# Altium footprint library Atlan.PcbLib: 283 footprints (part 17 of 18)
Each footprint in its own frame and in the unit in brackets; x right, y up, seen from the top. Pads: shape width x height; smd on the part's side, far side on the other; paste and mask are expansions set on the pad; w line width, h text height; cw(c..) or ccw(c..) is an arc to the next point about the centre after c.
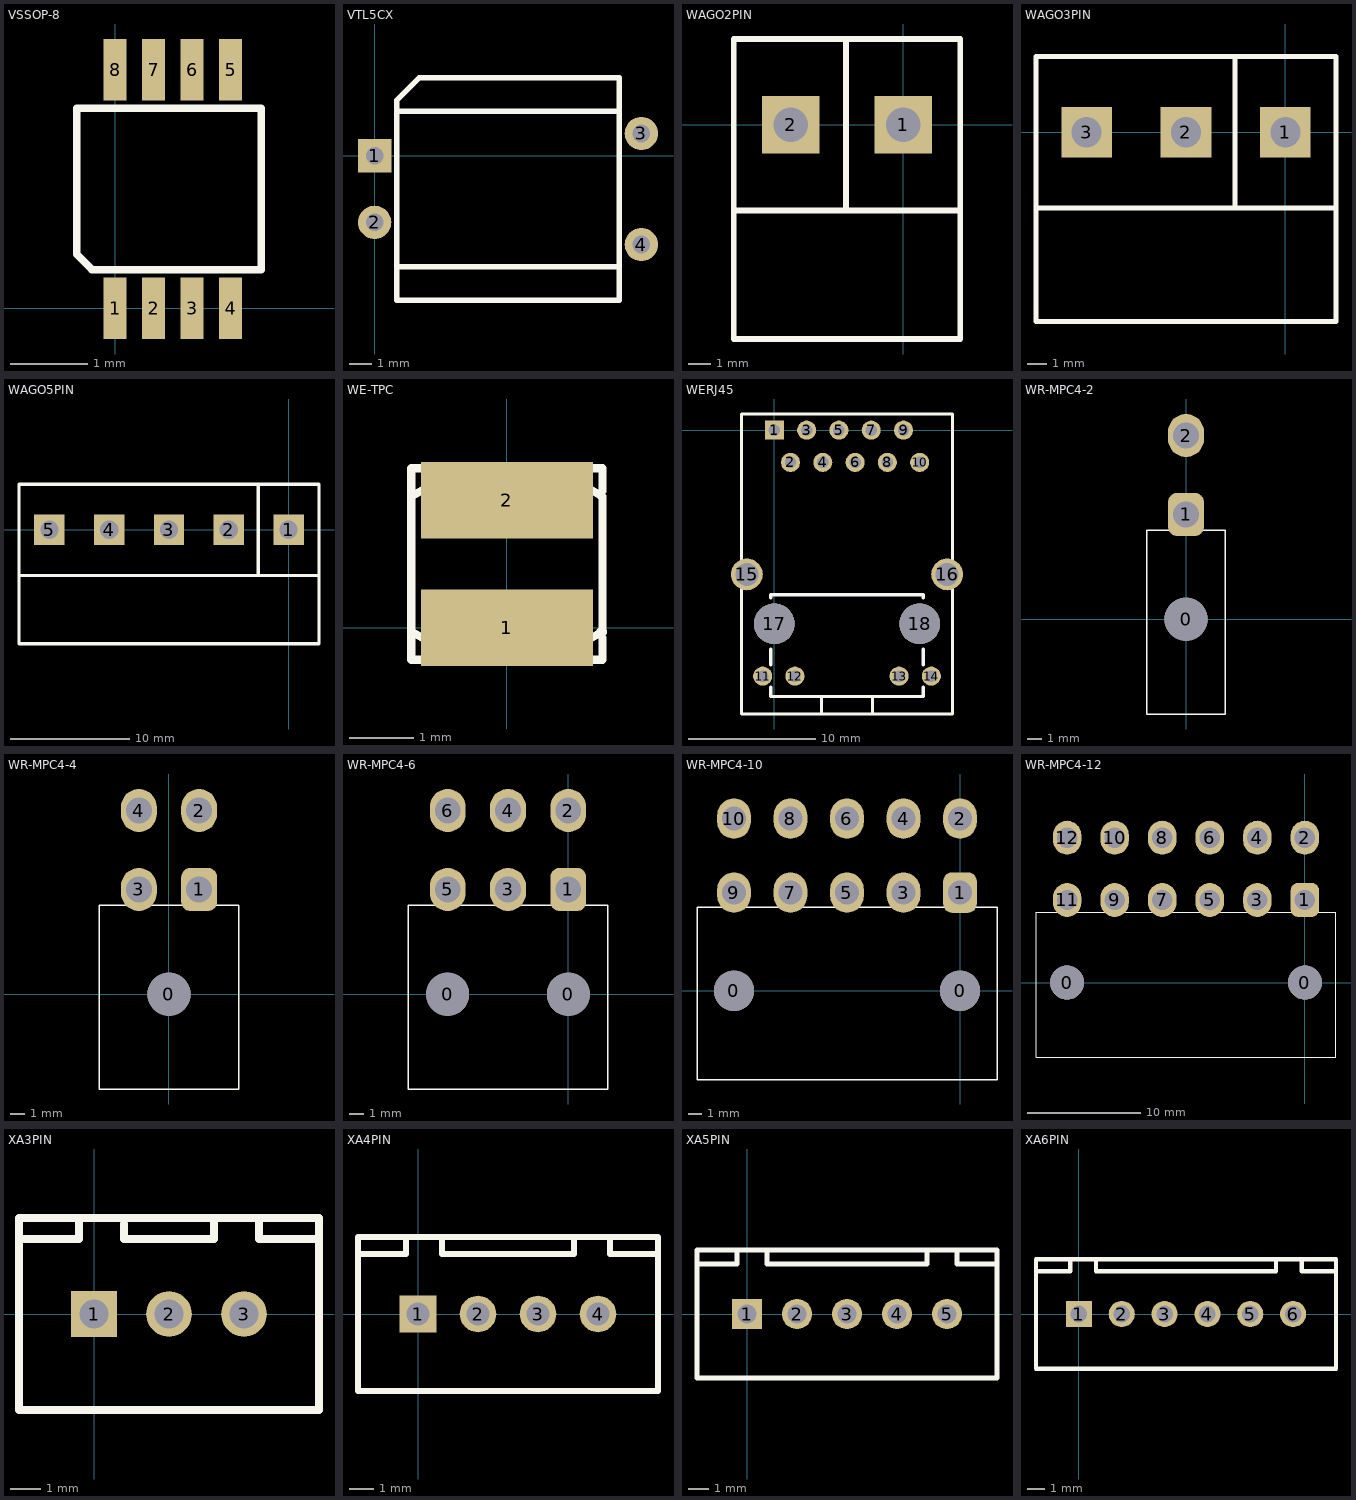
[diagram p16: the footprints below, top view; thin cyan lines are the x and y axes]

## VSSOP-8 [mm]
pads (8):
  rect 0.3x0.8 smd: 1(0,0) 2(0.5,0) 3(1,0) 4(1.5,0) 5(1.5,3.1) 6(1,3.1) 7(0.5,3.1) 8(0,3.1)
Top Overlay:
  lines w0.1: -0.5,0.7 -0.5,2.6 1.9,2.6 1.9,0.5 -0.3,0.5 -0.5,0.7
3D body: height 0.9, standoff 0, extent -0.5,0.5 1.9,2.6

## VTL5CX [mm]
pads (4):
  rect 1.5x1.5 hole 0.8: 1(0,0)
  round 1.5 hole 0.8: 2(0,-3) 3(12,1) 4(12,-4)
Top Overlay:
  lines w0.25: 1,-5 11,-5 ; 1,2 11,2 ; 1,-6.5 11,-6.5 11,3.5 2,3.5 1,2.5 1,-6.5
3D body: height 8.13, standoff 0, extent 1,-6.5 11,3.5

## WAGO2PIN [mil]
pads (2):
  rect 100x100 hole 60: 1(0,0) 2(-196.85,0)
Top Overlay:
  lines w10: -296.85,-150 100,-150 100,150 ; -100,-150 -100,150 ; 100,150 -296.85,150 -296.85,-375 100,-375 100,150

## WAGO3PIN [mil]
pads (3):
  rect 100x100 hole 60: 1(0,0) 2(-196.85,0) 3(-393.7,0)
Top Overlay:
  lines w10: -493.7,-150 100,-150 100,150 ; -100,-150 -100,150 ; 100,150 -493.7,150 -493.7,-375 100,-375 100,150

## WAGO5PIN [mil]
pads (5):
  rect 100x100 hole 60: 1(0,0) 2(-196.85,0) 3(-393.7,0) 4(-590.55,0) 5(-787.4,0)
Top Overlay:
  lines w10: -887.4,-150 100,-150 100,150 ; -100,-150 -100,150 ; 100,150 -887.4,150 -887.4,-375 100,-375 100,150

## WE-TPC [mm]
pads (2):
  rect 2.7x1.2 smd: 1(0,0) 2(0,2)
Top Overlay:
  lines w0.127: -1.5,-0.056 -1.25,-0.2 -1.25,-0.5 ; -1.5,2.056 -1.25,2.2 -1.25,2.5 ; 1.25,-0.5 1.25,-0.2 1.5,-0.056 ; 1.25,2.5 1.25,2.2 1.5,2.056 1.5,-0.056 ; 1.45,-0.085 1.45,-0.105 1.5,-0.155 1.5,-0.5 -1.5,-0.5 -1.5,2.5 1.5,2.5 1.5,2.145 1.45,2.095 1.45,2.085 ; 1.467,2.075 1.475,2.075 ; 1.469,-0.051 1.472,-0.057 1.481,-0.067 1.49,-0.072 1.497,-0.075 ; 1.47,2.073 1.47,2.074 1.473,2.075 1.475,2.075 ; 1.484,-0.072 1.493,-0.074 1.498,-0.075 ; 1.489,-0.074 1.492,-0.075 ; 1.489,-0.072 ccw(c1.501,-0.048) 1.498,-0.075 ; 1.489,2.062 1.486,2.067 1.482,2.072 1.48,2.074 1.477,2.075 1.475,2.075 ; 1.496,-0.058 1.496,-0.07 1.495,-0.074 ; 1.5,-0.045 cw(c0.737,-0.076) 1.501,-0.075 ; 1.482,-0.067 ccw(c1.502,-0.045) 1.495,-0.074 ; 1.482,-0.067 1.482,-0.067 ; 1.492,-0.075 1.481,-0.075 1.467,-0.075 1.482,-0.075 1.493,-0.075 ; 1.492,-0.075 1.493,-0.075 ; 1.493,-0.075 1.494,-0.075 ; 1.494,-0.075 1.495,-0.075 ; 1.493,-0.075 1.496,-0.075 ; 1.495,-0.075 1.495,-0.075 ; 1.495,-0.075 1.495,-0.075 ; 1.495,-0.075 1.495,-0.075 ; 1.495,-0.075 1.495,-0.074 ; 1.495,-0.074 1.496,-0.075 ; 1.496,-0.075 1.497,-0.075 ; 1.496,-0.075 1.499,-0.075 ; 1.497,-0.075 1.499,-0.075 ; 1.499,-0.075 1.499,-0.075 ; 1.499,-0.075 1.5,-0.075 ; 1.5,-0.075 ccw(c0.836,-0.076) 1.499,-0.056 ; 1.5,-0.075 1.5,-0.075 ; 1.5,-0.075 1.5,-0.075 ; 1.5,-0.075 1.5,-0.075 ; 1.5,-0.075 1.5,-0.075 ; 1.5,-0.075 1.5,-0.075 ; 1.5,-0.075 1.5,-0.075 ; 1.5,-0.075 1.5,-0.075 ; 1.5,-0.075 1.5,-0.075 ; 1.499,-0.075 1.5,-0.075 ; 1.5,-0.075 1.501,-0.075 ; 1.501,-0.075 1.501,-0.075 ; 1.501,-0.075 1.501,-0.075 ; 1.501,-0.075 1.501,-0.075 ; 1.501,-0.075 1.501,-0.075 ; 1.501,-0.075 1.501,-0.075 ; 1.501,-0.075 1.501,-0.075
3D body "STEP-WE-LQS-3015-rev1.stp": height 1.55, standoff 0.05, extent -1.5,-0.5 1.5,2.5

## WERJ45 [mm]
pads (18):
  rect 1.5x1.5 hole 0.9: 1(0,0)
  round 1.5 hole 0.9: 2(1.27,-2.54) 3(2.54,0) 4(3.81,-2.54) 5(5.08,0) 6(6.35,-2.54) 7(7.62,0) 8(8.89,-2.54) 9(10.16,0) 10(11.43,-2.54) 11(-0.92,-19.35) 12(1.62,-19.35) 13(9.81,-19.35) 14(12.35,-19.35)
  round 2.5 hole 1.8: 15(-2.16,-11.35) 16(13.59,-11.35)
  round 3.2 hole 3.2 unplated: 17(0,-15.24) 18(11.43,-15.24)
Top Overlay:
  lines w0.25: -0.285,-20.205 -0.285,-20.955 5.715,-20.955 11.715,-20.955 11.715,-20.205 ; -0.285,-18.455 -0.285,-17.205 ; -0.285,-13.205 -0.285,-12.955 11.715,-12.955 11.715,-13.205 ; 3.715,-22.33 3.715,-20.955 ; 7.715,-22.33 7.715,-20.955 ; 11.715,-18.455 11.715,-17.205 ; -2.585,-22.33 -2.585,1.27 5.715,1.27 14.015,1.27 14.015,-22.33 -2.585,-22.33
3D body: height 17.1, standoff 0, extent -2.5,-22.25 14,1.25

## WR-MPC4-2 [mm] "Connector WR-MPC4 Series"
pads (3):
  round 3 hole 3 unplated: 0(0,0)
  rrect50% 2.5x3 hole 1.8: 1(0,7.3)
  oval 2.5x3 hole 1.8: 2(0,12.8)
Top Overlay:
  lines w0.1: -2.75,-6.6 2.75,-6.6 2.75,6.2 -2.75,6.2 -2.75,-6.6
3D body: height 10, standoff 0, extent -2.75,-6.6 2.75,6.2

## WR-MPC4-4 [mm] "Connector WR-MPC4 Series"
pads (5):
  round 3 hole 3 unplated: 0(0,0)
  rrect50% 2.5x3 hole 1.8: 1(2.1,7.3)
  oval 2.5x3 hole 1.8: 2(2.1,12.8) 3(-2.1,7.3) 4(-2.1,12.8)
Top Overlay:
  lines w0.1: -4.85,-6.6 -4.85,6.2 4.85,6.2 4.85,-6.6 -4.85,-6.6
3D body: height 10, standoff 0, extent -4.85,-6.6 4.85,6.2

## WR-MPC4-6 [mm] "Connector WR-MPC4 Series"
pads (8):
  round 3 hole 3 unplated: 0(-8.4,0) 0(0,0)
  rrect50% 2.5x3 hole 1.8: 1(0,7.3)
  oval 2.5x3 hole 1.8: 2(0,12.8) 3(-4.2,7.3) 4(-4.2,12.8) 5(-8.4,7.3) 6(-8.4,12.8)
Top Overlay:
  lines w0.1: -11.15,-6.6 -11.15,6.2 2.75,6.2 2.75,-6.6 -11.15,-6.6
3D body: height 10, standoff 0, extent -11.15,-6.6 2.75,6.2

## WR-MPC4-10 [mm] "Connector WR-MPC4 Series"
pads (12):
  round 3 hole 3 unplated: 0(-16.8,0) 0(0,0)
  rrect50% 2.5x3 hole 1.8: 1(0,7.3)
  oval 2.5x3 hole 1.8: 2(0,12.8) 3(-4.2,7.3) 4(-4.2,12.8) 5(-8.4,7.3) 6(-8.4,12.8) 7(-12.6,7.3) 8(-12.6,12.8) 9(-16.8,7.3) 10(-16.8,12.8)
Top Overlay:
  lines w0.1: -19.55,-6.6 -19.55,6.2 2.75,6.2 2.75,-6.6 -19.55,-6.6
3D body: height 10, standoff 0, extent -19.55,-6.6 2.75,6.2

## WR-MPC4-12 [mm] "Connector WR-MPC4 Series"
pads (14):
  round 3 hole 3 unplated: 0(-21,0) 0(0,0)
  rrect50% 2.5x3 hole 1.8: 1(0,7.3)
  oval 2.5x3 hole 1.8: 2(0,12.8) 3(-4.2,7.3) 4(-4.2,12.8) 5(-8.4,7.3) 6(-8.4,12.8) 7(-12.6,7.3) 8(-12.6,12.8) 9(-16.8,7.3) 10(-16.8,12.8) 11(-21,7.3) 12(-21,12.8)
Top Overlay:
  lines w0.1: -23.75,-6.6 2.75,-6.6 2.75,6.2 -23.75,6.2 -23.75,-6.6
3D body: height 10, standoff 0, extent -23.75,-6.6 2.75,6.2

## XA3PIN [mil]
pads (3):
  rect 60x60 hole 38: 1(0,0)
  round 60 hole 38: 2(98.43,0) 3(196.85,0)
Top Overlay:
  lines w10: -98.43,98.43 -19.68,98.43 -19.68,125.98 ; 39.37,118.11 39.37,98.43 157.48,98.43 157.48,125.98 ; 216.54,125.98 216.54,98.43 295.28,98.43 ; -98.43,-125.98 -98.43,125.98 295.28,125.98 295.28,-125.98 -98.43,-125.98

## XA4PIN [mil]
pads (4):
  rect 60x60 hole 38: 1(0,0)
  round 60 hole 38: 2(98.43,0) 3(196.85,0) 4(295.28,0)
Top Overlay:
  lines w10: -98.43,98.43 -19.68,98.43 -19.68,125.98 ; 39.37,125.98 39.37,98.43 255.91,98.43 255.91,125.98 ; 314.96,125.98 314.96,98.43 393.7,98.43 ; -98.43,-125.98 -98.43,125.98 393.7,125.98 393.7,-125.98 -98.43,-125.98

## XA5PIN [mil]
pads (5):
  rect 60x60 hole 38: 1(0,0)
  round 60 hole 38: 2(98.43,0) 3(196.85,0) 4(295.28,0) 5(393.7,0)
Top Overlay:
  lines w10: -98.43,98.43 -19.68,98.43 -19.68,125.98 ; 39.37,125.98 39.37,98.43 354.33,98.43 354.33,125.98 ; 413.39,125.98 413.39,98.43 492.13,98.43 ; -98.43,-125.98 492.13,-125.98 492.13,125.98 -98.43,125.98 -98.43,-125.98

## XA6PIN [mil]
pads (6):
  rect 60x60 hole 38: 1(0,0)
  round 60 hole 38: 2(98.43,0) 3(196.85,0) 4(295.28,0) 5(393.7,0) 6(492.13,0)
Top Overlay:
  lines w10: -98.43,98.43 -19.68,98.43 -19.68,125.98 ; 39.37,125.98 39.37,98.43 452.76,98.43 452.76,125.98 ; 511.81,125.98 511.81,98.43 590.55,98.43 ; -98.43,-125.98 -98.43,125.98 590.55,125.98 590.55,-125.98 -98.43,-125.98